# Altium footprint library MYS-Library.PcbLib: 94 footprints (part 4 of 6)
Each footprint in its own frame and in the unit in brackets; x right, y up, seen from the top. Pads: shape width x height; smd on the part's side, far side on the other; paste and mask are expansions set on the pad; w line width, h text height; cw(c..) or ccw(c..) is an arc to the next point about the centre after c.
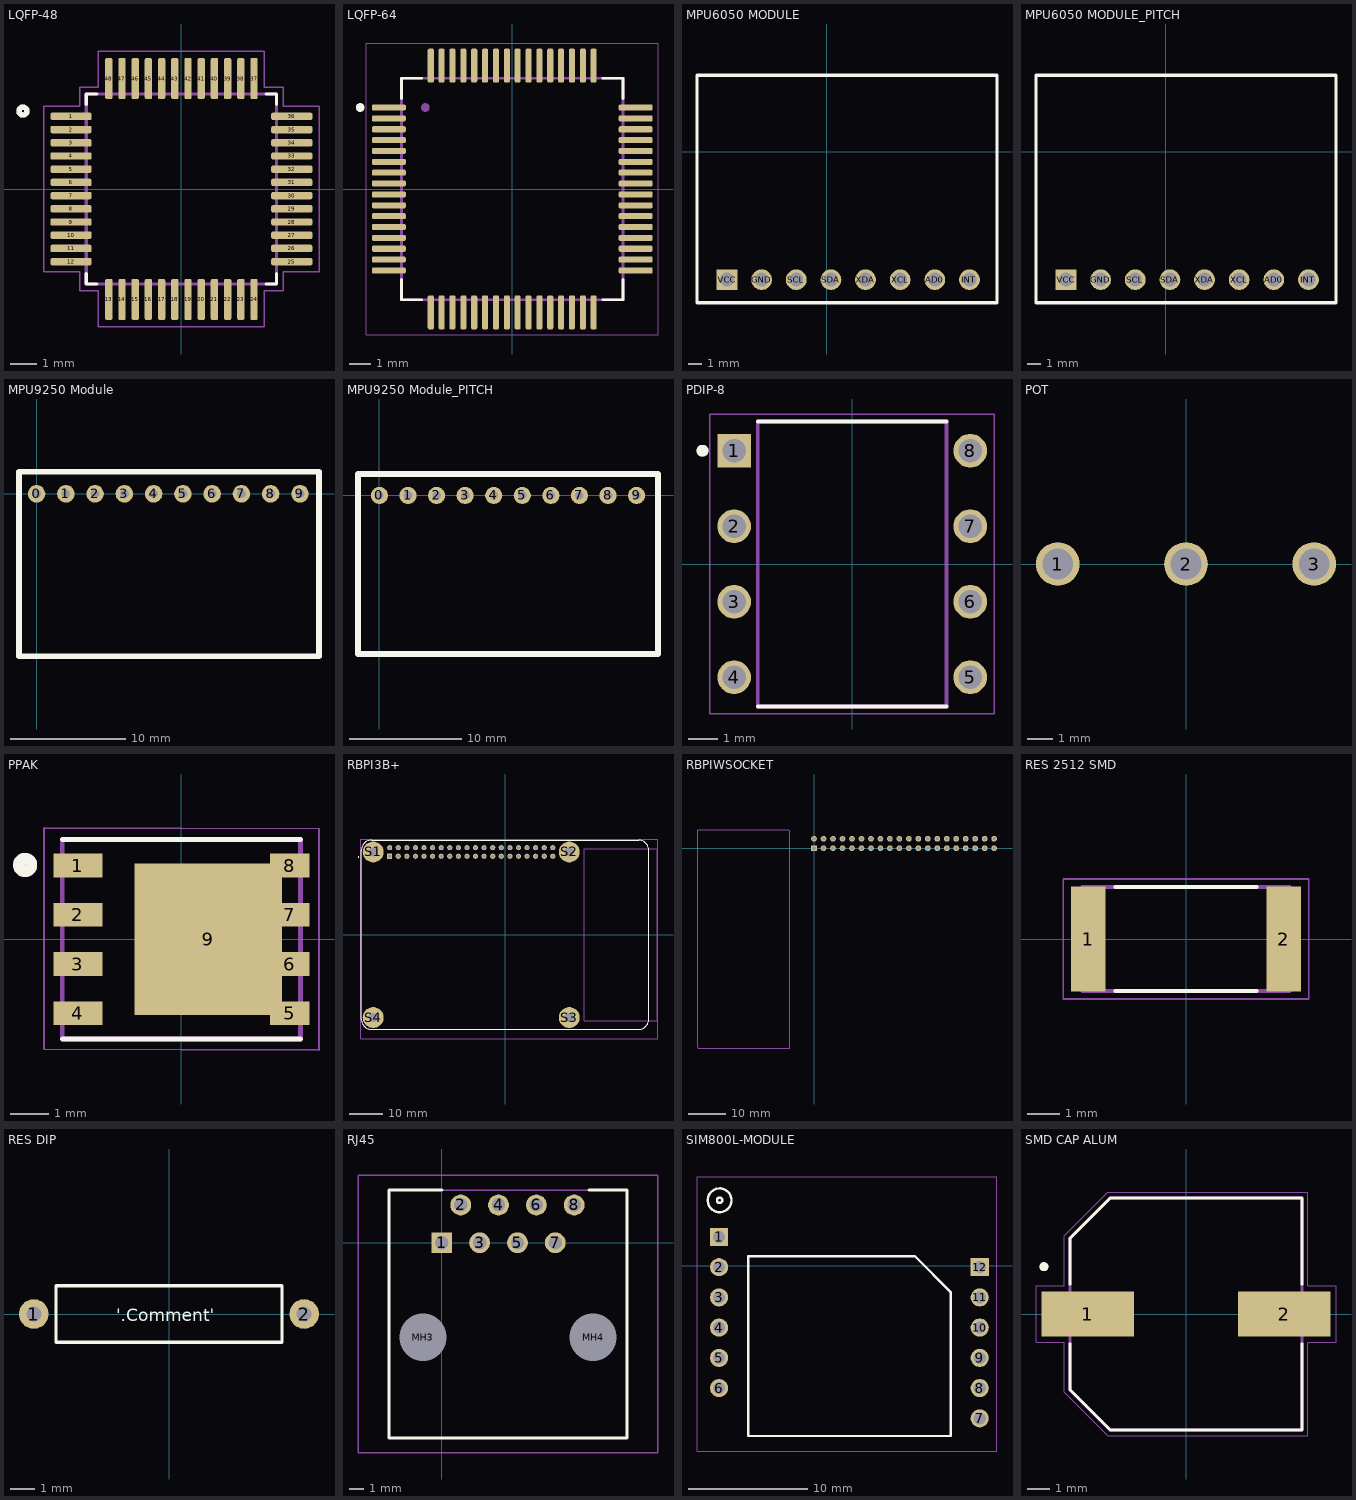
[diagram p3: the footprints below, top view; thin cyan lines are the x and y axes]

## LQFP-48 [mm]
pads (48):
  rrect50% 1.56x0.28 smd: 1(-4.18,2.75) 2(-4.18,2.25) 3(-4.18,1.75) 4(-4.18,1.25) 5(-4.18,0.75) 6(-4.18,0.25) 7(-4.18,-0.25) 8(-4.18,-0.75) 9(-4.18,-1.25) 10(-4.18,-1.75) 11(-4.18,-2.25) 12(-4.18,-2.75) 25(4.18,-2.75) 26(4.18,-2.25) 27(4.18,-1.75) 28(4.18,-1.25) 29(4.18,-0.75) 30(4.18,-0.25) 31(4.18,0.25) 32(4.18,0.75) 33(4.18,1.25) 34(4.18,1.75) 35(4.18,2.25) 36(4.18,2.75)
  rrect50% 0.28x1.56 smd: 13(-2.75,-4.18) 14(-2.25,-4.18) 15(-1.75,-4.18) 16(-1.25,-4.18) 17(-0.75,-4.18) 18(-0.25,-4.18) 19(0.25,-4.18) 20(0.75,-4.18) 21(1.25,-4.18) 22(1.75,-4.18) 23(2.25,-4.18) 24(2.75,-4.18) 37(2.75,4.18) 38(2.25,4.18) 39(1.75,4.18) 40(1.25,4.18) 41(0.75,4.18) 42(0.25,4.18) 43(-0.25,4.18) 44(-0.75,4.18) 45(-1.25,4.18) 46(-1.75,4.18) 47(-2.25,4.18) 48(-2.75,4.18)
Top Overlay:
  circle w0.2: c-6,2.95 r0.15
  lines w0.127: -3.6,-3.21 -3.6,-3.6 -3.21,-3.6 ; -3.6,3.21 -3.6,3.6 -3.21,3.6 ; 3.21,-3.6 3.6,-3.6 3.6,-3.21 ; 3.21,3.6 3.6,3.6 3.6,3.21
Mechanical 13:
  circle w0.2: c-6,2.95 r0.15
  lines w0.127: -3.6,-3.6 3.6,-3.6 3.6,3.6 -3.6,3.6 -3.6,-3.6
Mechanical 15:
  lines w0.05: -5.21,-3.14 -3.85,-3.14 -3.85,-3.85 -3.14,-3.85 -3.14,-5.21 3.14,-5.21 3.14,-3.85 3.85,-3.85 3.85,-3.14 5.21,-3.14 5.21,3.14 3.85,3.14 3.85,3.85 3.14,3.85 3.14,5.21 -3.14,5.21 -3.14,3.85 -3.85,3.85 -3.85,3.14 -5.21,3.14 -5.21,-3.14
3D body "step_temp.STEP": height 1.6, standoff 0, extent -4.5,-4.5 4.5,4.5

## LQFP-64 [mm]
pads (64):
  rrect50% 1.56x0.28 smd: 1(-5.68,3.75) 2(-5.68,3.25) 3(-5.68,2.75) 4(-5.68,2.25) 5(-5.68,1.75) 6(-5.68,1.25) 7(-5.68,0.75) 8(-5.68,0.25) 9(-5.68,-0.25) 10(-5.68,-0.75) 11(-5.68,-1.25) 12(-5.68,-1.75) 13(-5.68,-2.25) 14(-5.68,-2.75) 15(-5.68,-3.25) 16(-5.68,-3.75) 33(5.68,-3.75) 34(5.68,-3.25) 35(5.68,-2.75) 36(5.68,-2.25) 37(5.68,-1.75) 38(5.68,-1.25) 39(5.68,-0.75) 40(5.68,-0.25) 41(5.68,0.25) 42(5.68,0.75) 43(5.68,1.25) 44(5.68,1.75) 45(5.68,2.25) 46(5.68,2.75) 47(5.68,3.25) 48(5.68,3.75)
  rrect50% 0.28x1.56 smd: 17(-3.75,-5.68) 18(-3.25,-5.68) 19(-2.75,-5.68) 20(-2.25,-5.68) 21(-1.75,-5.68) 22(-1.25,-5.68) 23(-0.75,-5.68) 24(-0.25,-5.68) 25(0.25,-5.68) 26(0.75,-5.68) 27(1.25,-5.68) 28(1.75,-5.68) 29(2.25,-5.68) 30(2.75,-5.68) 31(3.25,-5.68) 32(3.75,-5.68) 49(3.75,5.68) 50(3.25,5.68) 51(2.75,5.68) 52(2.25,5.68) 53(1.75,5.68) 54(1.25,5.68) 55(0.75,5.68) 56(0.25,5.68) 57(-0.25,5.68) 58(-0.75,5.68) 59(-1.25,5.68) 60(-1.75,5.68) 61(-2.25,5.68) 62(-2.75,5.68) 63(-3.25,5.68) 64(-3.75,5.68)
Top Overlay:
  circle w0.2: c-7,3.75 r0.1
  lines w0.127: -5.1,-4.17 -5.1,-5.1 -4.17,-5.1 ; -5.1,4.17 -5.1,5.1 -4.17,5.1 ; 4.17,-5.1 5.1,-5.1 5.1,-4.17 ; 4.17,5.1 5.1,5.1 5.1,4.17
Mechanical 13:
  circle w0.2: c-4,3.75 r0.1
  lines w0.127: -5.1,-5.1 5.1,-5.1 5.1,5.1 -5.1,5.1 -5.1,-5.1
Mechanical 15:
  lines w0.05: -6.71,-6.71 6.71,-6.71 6.71,6.71 -6.71,6.71 -6.71,-6.71
3D body "STM32F446RET6U.STEP": height 1.6, standoff 0, extent -6,-6 6,6

## MPU6050 MODULE [mil]
pads (8):
  round 60 hole 40.16: AD0(311.54,-370.08) GND(-188.46,-370.08) INT(411.54,-370.08) SCL(-88.46,-370.08) SDA(11.54,-370.08) XCL(211.54,-370.08) XDA(111.54,-370.08)
  rect 60x60 hole 40.16: VCC(-288.46,-370.08)
Top Overlay:
  lines w10: -375.08,-437.01 -375.08,220.47 491.06,220.47 491.06,-437.01 -375.08,-437.01
3D body "MPU 6050 IMU.STEP": height 241.85, standoff -198.15, extent -357.65,-420.28 473.35,204.72

## MPU6050 MODULE_PITCH [mil]
pads (8):
  round 60 hole 40.16: AD0(311.54,-370.08) GND(-188.46,-370.08) INT(411.54,-370.08) SCL(-88.46,-370.08) SDA(11.54,-370.08) XCL(211.54,-370.08) XDA(111.54,-370.08)
  rect 60x60 hole 40.16: VCC(-288.46,-370.08)
Top Overlay:
  lines w10: -375.08,-437.01 -375.08,220.47 491.06,220.47 491.06,-437.01 -375.08,-437.01
3D body "MPU 6050 IMU.STEP": height 556.81, standoff 116.81, extent -357.65,-420.28 473.35,204.72
3D body "PPTC081LFBN-RC--3DModel-STEP-56544.STEP": height 335, standoff -126, extent -350,-420 470,-320

## MPU9250 Module [mil]
pads (10):
  round 60 hole 30: 0(0,0) 1(100,0) 2(200,0) 3(300,0) 4(400,0) 5(500,0) 6(600,0) 7(700,0) 8(800,0) 9(900,0)
Top Overlay:
  lines w19.68: -60,-554.92 -60,75 965,75 965,-554.92 -60,-554.92
3D body "MPU-9250.stp": height 303.19, standoff -199.77, extent -50,-535 950,55.55

## MPU9250 Module_PITCH [mil]
pads (10):
  round 60 hole 30: 0(0,0) 1(100,0) 2(200,0) 3(300,0) 4(400,0) 5(500,0) 6(600,0) 7(700,0) 8(800,0) 9(900,0)
Top Overlay:
  lines w19.68: -75,-554.92 -75,75 975,75 975,-554.92 -75,-554.92
3D body "MPU-9250.stp": height 421.3, standoff -81.66, extent -50,-527.56 950,62.99
3D body "10-Pin Header - Female - 2.54mm.step": height 196.85, standoff -118.11, extent -60,-43.31 959.68,55.12

## PDIP-8 [mm]
pads (8):
  rect 1.13x1.13 / inner round 1.13 / far side rect 1.13x1.13 hole 0.78: 1(-3.97,3.81)
  round 1.13 hole 0.78: 2(-3.97,1.27) 3(-3.97,-1.27) 4(-3.97,-3.81) 5(3.97,-3.81) 6(3.97,-1.27) 7(3.97,1.27) 8(3.97,3.81)
Top Overlay:
  circle w0.2: c-5.035,3.81 r0.1
  lines w0.127: -3.175,-4.795 3.175,-4.795 ; -3.175,4.795 3.175,4.795
Mechanical 13:
  circle w0.2: c-5.035,3.81 r0.1
  lines w0.127: -3.175,-4.795 -3.175,4.795 3.175,4.795 3.175,-4.795 -3.175,-4.795
Mechanical 15:
  lines w0.05: -4.785,-5.045 -4.785,5.045 4.785,5.045 4.785,-5.045 -4.785,-5.045
3D body "step_temp.STEP": height 5.08, standoff -3.81, extent -3.937,-4.794 3.937,4.794

## POT [mm]
pads (3):
  round 1.7 hole 1.2: 1(-5,0) 2(0,0) 3(5,0)
3D body "POTENTIOMETER.step": height 22.38, standoff -2.56, extent -8.382,-18.63 8.382,5.5

## PPAK [mm]
pads (9):
  rect 1.27x0.61 smd: 1(-2.67,1.905) 2(-2.67,0.635) 3(-2.67,-0.635) 4(-2.67,-1.905)
  rect 1.02x0.61 smd: 5(2.795,-1.905) 6(2.795,-0.635) 7(2.795,0.635) 8(2.795,1.905)
  rect 3.81x3.91 smd: 9(0.69,0)
Top Overlay:
  circle w0.3: c-4.03,1.92 r0.16
  lines w0.127: -3.075,-2.575 3.075,-2.575 ; -3.075,2.575 3.075,2.575
Mechanical 13:
  circle w0.3: c-4.03,1.92 r0.16
  lines w0.127: -3.075,-2.575 -3.075,2.575 3.075,2.575 3.075,-2.575 -3.075,-2.575
Mechanical 15:
  lines w0.05: -3.55,-2.834 -3.55,2.874 3.55,2.854 3.55,-2.854 -3.55,-2.834
3D body "SIR426DP-T1-GE3.STEP": height 1.12, standoff 0, extent -3.073,-2.578 3.073,2.578

## RBPI3B+ [mil]
pads (44):
  rect 60x60 / inner round 60 / far side rect 60x60 hole 40: 1(-1343.7,914.57)
  round 60 hole 40: 2(-1343.7,1014.57) 3(-1243.7,914.57) 4(-1243.7,1014.57) 5(-1143.7,914.57) 6(-1143.7,1014.57) 7(-1043.7,914.57) 8(-1043.7,1014.57) 9(-943.7,914.57) 10(-943.7,1014.57) 11(-843.7,914.57) 12(-843.7,1014.57) 13(-743.7,914.57) 14(-743.7,1014.57) 15(-643.7,914.57) 16(-643.7,1014.57) 17(-543.7,914.57) 18(-543.7,1014.57) 19(-443.7,914.57) 20(-443.7,1014.57) 21(-343.7,914.57) 22(-343.7,1014.57) 23(-243.7,914.57) 24(-243.7,1014.57) 25(-143.7,914.57) 26(-143.7,1014.57) 27(-43.7,914.57) 28(-43.7,1014.57) 29(56.3,914.57) 30(56.3,1014.57) 31(156.3,914.57) 32(156.3,1014.57) 33(256.3,914.57) 34(256.3,1014.57) 35(356.3,914.57) 36(356.3,1014.57) 37(456.3,914.57) 38(456.3,1014.57) 39(556.3,914.57) 40(556.3,1014.57)
  round 244.09 hole 108.27: S1(-1535.43,964.57) S2(748.03,964.57) S3(748.03,-964.57) S4(-1535.43,-964.57)
Top Overlay:
  circle w7.87: c-1708.66,905.51 r3.94
  lines w5: -1673.23,-984.25 ccw(c-1555.12,-984.25) -1555.12,-1102.36 1555.12,-1102.36 ccw(c1555.12,-984.25) 1673.23,-984.25 1673.23,984.25 ccw(c1555.12,984.25) 1555.12,1102.36 -1555.12,1102.36 ccw(c-1555.12,984.25) -1673.23,984.25 -1673.23,-984.25
Mechanical 13:
  circle w7.87: c-1708.66,905.51 r3.94
  lines w5: -1673.23,-984.25 ccw(c-1555.12,-984.25) -1555.12,-1102.36 1555.12,-1102.36 ccw(c1555.12,-984.25) 1673.23,-984.25 1673.23,984.25 ccw(c1555.12,984.25) 1555.12,1102.36 -1555.12,1102.36 ccw(c-1555.12,984.25) -1673.23,984.25 -1673.23,-984.25 ; 925.2,-1003.94 925.2,1003.94 1771.65,1003.94 1771.65,-1003.94 925.2,-1003.94
Mechanical 15:
  lines w1.97: -1683.07,-1210.63 1781.5,-1210.63 1781.5,1112.2 -1683.07,1112.2 -1683.07,-1210.63
3D body "step_temp.STEP": height 700.79, standoff -78.74, extent -1673.23,-1181.1 1783.46,1102.36

## RBPIWSOCKET [mil]
pads (40):
  rect 60x60 / inner round 60 / far side rect 60x60 hole 40: 1(0,0)
  round 60 hole 40: 2(0,100) 3(100,0) 4(100,100) 5(200,0) 6(200,100) 7(300,0) 8(300,100) 9(400,0) 10(400,100) 11(500,0) 12(500,100) 13(600,0) 14(600,100) 15(700,0) 16(700,100) 17(800,0) 18(800,100) 19(900,0) 20(900,100) 21(1000,0) 22(1000,100) 23(1100,0) 24(1100,100) 25(1200,0) 26(1200,100) 27(1300,0) 28(1300,100) 29(1400,0) 30(1400,100) 31(1500,0) 32(1500,100) 33(1600,0) 34(1600,100) 35(1700,0) 36(1700,100) 37(1800,0) 38(1800,100) 39(1900,0) 40(1900,100)
Mechanical 13:
  lines w5: -1235,-2095 -1220,-2110 -255,-2110 -255,180 -270,195 -1235,195 -1235,-2095
3D body "step_temp.STEP": height 551.18, standoff -228.35, extent -1221.69,-2098.46 2235,185
3D body "2x20 Stacking Header.step": height 338.98, standoff -224.02, extent -58.78,-50 1968.78,150

## RES 2512 SMD [mm]
pads (2):
  rect 1.07x3.27 smd: 1(-3.055,0) 2(3.055,0)
Top Overlay:
  lines w0.127: -2.2,-1.63 2.2,-1.63 ; -2.2,1.63 2.2,1.63
Mechanical 13:
  lines w0.127: -3.23,-1.63 3.23,-1.63 3.23,1.63 -3.23,1.63 -3.23,-1.63
Mechanical 15:
  lines w0.05: -3.84,-1.875 3.84,-1.875 3.84,1.875 -3.84,1.875 -3.84,-1.875
3D body "PT2512FK-070R1L--3DModel-STEP-269445.STEP": height 0.65, standoff 0, extent -3.175,-1.6 3.175,1.6

## RES DIP [mm]
pads (2):
  round 1.2 hole 0.6: 1(-5.461,0) 2(5.461,0)
Top Overlay:
  lines w0.127: -4.572,-1.143 4.572,-1.143 4.572,1.143 -4.572,1.143 -4.572,-1.143
  text "'.Comment'" at -2.124,-0.292 h0.5
3D body "RES-0.25W v4.step": height 3.3, standoff -5, extent -5.927,-1.3 5.927,1.3

## RJ45 [mm]
pads (10):
  rect 1.4x1.4 hole 0.9: 1(0,0)
  round 1.4 hole 0.9: 2(1.27,2.54) 3(2.54,0) 4(3.81,2.54) 5(5.08,0) 6(6.35,2.54) 7(7.62,0) 8(8.89,2.54)
  round 1.585 hole 3.17 unplated: MH3(-1.27,-6.35) MH4(10.16,-6.35)
Top Overlay:
  lines w0.2: 0,3.54 -3.555,3.54 -3.555,-13.11 12.445,-13.11 12.445,3.54 9.9,3.54
Mechanical 13:
  lines w0.1: -3.555,-13.11 12.445,-13.11 12.445,3.54 -3.555,3.54 -3.555,-13.11
Mechanical 15:
  lines w0.1: -5.63,-14.11 14.52,-14.11 14.52,4.54 -5.63,4.54 -5.63,-14.11
3D body "MOLEX_0955012882.STEP": height 11.5, standoff -3.3, extent -3.175,-14.224 12.065,3.876

## SIM800L-MODULE [mm]
pads (12):
  rect 1.524x1.524 hole 1.02: 1(8.35,2.425) 12(30.25,-0.115)
  round 1.524 hole 1.02: 2(8.35,-0.115) 3(8.35,-2.655) 4(8.35,-5.195) 5(8.35,-7.735) 6(8.35,-10.275) 7(30.25,-12.815) 8(30.25,-10.275) 9(30.25,-7.735) 10(30.25,-5.195) 11(30.25,-2.655)
Top Overlay:
  circle w0.2: c8.4,5.5 r1
  circle w0.2: c8.4,5.5 r0.224
  lines w0.2: 10.8,-14.3 10.8,0.8 24.8,0.8 27.8,-2.2 27.8,-14.3 10.8,-14.3
Mechanical 15:
  lines w0.1: 6.5,-15.6 6.5,7.5 31.7,7.5 31.7,-15.6 6.5,-15.6
3D body "6x_Male_Pin_2.54_mm.STEP": height 5.46, standoff -5.64, extent 29.05,-14.17 31.45,1.07
3D body "SIM800L v10.step": height 6.48, standoff 0.71, extent 6.575,-15.55 31.593,7.45
3D body "6x_Male_Pin_2.54_mm.STEP": height 5.24, standoff -5.86, extent 7.175,-11.57 9.575,3.67

## SMD CAP ALUM [mm] "10x10mm"
pads (2):
  rect 4.1x2 smd: 1(-4.35,0) 2(4.35,0)
Top Overlay:
  circle w0.2: c-6.3,2.1 r0.1
  lines w0.127: -5.15,-1.32 -5.15,-3.35 -3.35,-5.15 5.15,-5.15 5.15,-1.32 ; -5.15,1.32 -5.15,3.35 -3.35,5.15 5.15,5.15 5.15,1.32
Mechanical 13:
  circle w0.2: c-6.3,2.1 r0.1
  lines w0.127: -5.15,-3.35 -5.15,3.35 -3.35,5.15 5.15,5.15 5.15,-5.15 -3.35,-5.15 -5.15,-3.35
Mechanical 15:
  lines w0.05: -6.65,-1.25 -5.4,-1.25 -5.4,-3.475 -3.475,-5.4 5.4,-5.4 5.4,-1.25 6.65,-1.25 6.65,1.25 5.4,1.25 5.4,5.4 -3.475,5.4 -5.4,3.475 -5.4,1.25 -6.65,1.25 -6.65,-1.25
3D body "step_temp.STEP": height 9.3, standoff -0.9, extent -5.85,-5.15 5.85,5.15